# Altium footprint library SMT.PcbLib: 325 footprints (part 3 of 21)
Each footprint in its own frame and in the unit in brackets; x right, y up, seen from the top. Pads: shape width x height; smd on the part's side, far side on the other; paste and mask are expansions set on the pad; w line width, h text height; cw(c..) or ccw(c..) is an arc to the next point about the centre after c.
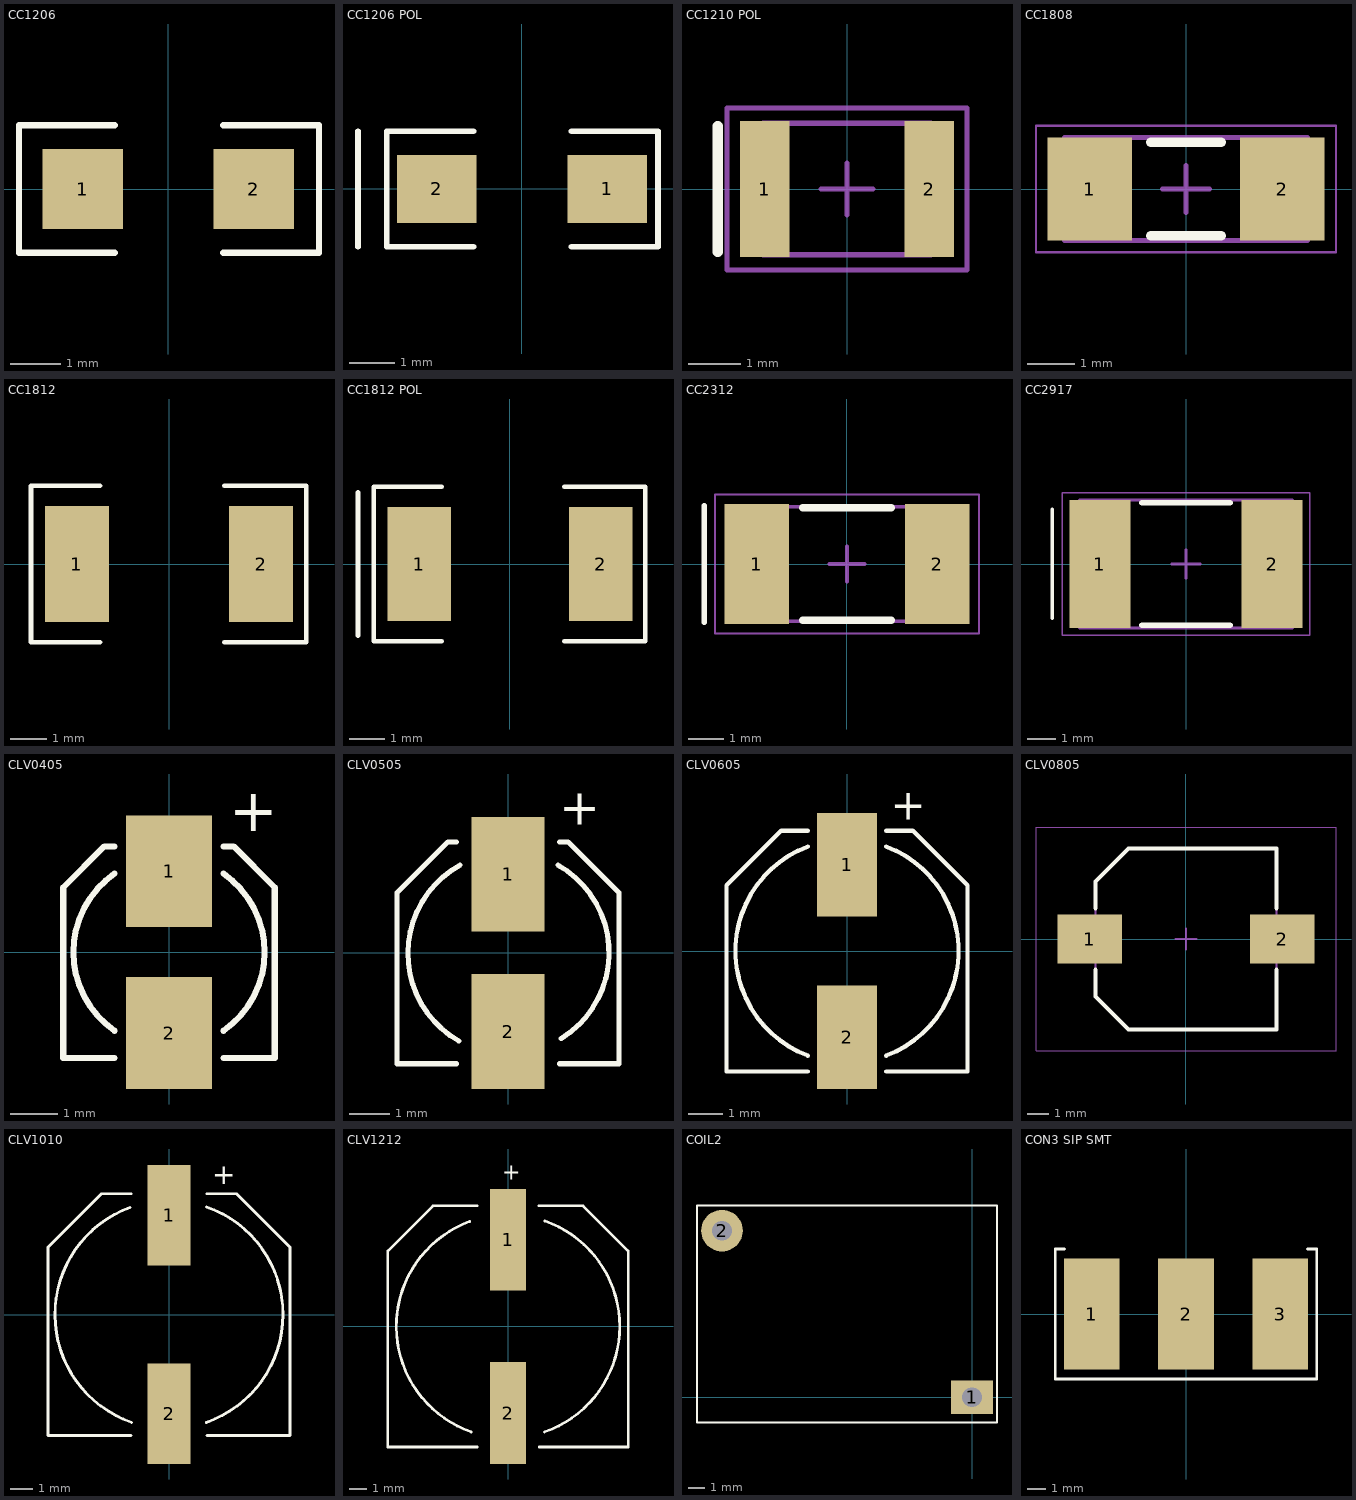
[diagram p2: the footprints below, top view; thin cyan lines are the x and y axes]

## CC1206 [mil]
pads (2):
  rect 63x63 smd: 1(-67,0) 2(67,0)
TopOverlay:
  lines w5: -42,-50 -117,-50 -117,50 -42,50 ; 43,-50 118,-50 118,50 43,50

## CC1206 POL [mm]
pads (2):
  rect 1.75x1.5 smd: 1(1.875,0) 2(-1.875,0)
TopOverlay:
  lines w0.127: -3.607,-1.27 -3.607,1.27 ; -1.067,-1.27 -2.972,-1.27 -2.972,1.27 -1.067,1.27 ; 1.092,-1.27 2.997,-1.27 2.997,1.27 1.092,1.27
3D body: height 0.75, standoff 0, extent -1.75,-0.75 1.75,0.75

## CC1210 POL [mm]
height 2.79
pads (2):
  rect 0.95x2.6 smd: 1(-1.575,0) 2(1.575,0)
TopOverlay:
  lines w0.2: -2.478,-1.2 -2.478,1.2
Mechanical13:
  lines w0.1: -1.61,-1.26 1.61,-1.26 1.61,1.26 -1.61,1.26 -1.61,-1.26
Mechanical15:
  lines w0.1: -0.5,0 0.5,0 ; 0,-0.5 0,0.5 ; -2.3,-1.55 2.3,-1.55 2.3,1.55 -2.3,1.55 -2.3,-1.55
3D body: height 2.79, standoff 0, extent -1.61,-1.26 1.61,1.26

## CC1808 [mm]
height 1.6
pads (2):
  rect 1.8x2.2 smd: 1(-2.05,0) 2(2.05,0)
TopOverlay:
  lines w0.2: -0.75,-1 0.75,-1 ; -0.75,1 0.75,1
Mechanical13:
  lines w0.1: -2.6,-1.1 2.6,-1.1 2.6,1.1 -2.6,1.1 -2.6,-1.1
Mechanical15:
  lines w0.05: -3.2,-1.35 3.2,-1.35 3.2,1.35 -3.2,1.35 -3.2,-1.35
  lines w0.1: -0.5,0 0.5,0 ; 0,-0.5 0,0.5
3D body: height 1.6, standoff 0, extent 2,-1.1 2.6,1.1
3D body: height 1.6, standoff 0, extent -2.6,-1.1 -2,1.1
3D body: height 1.6, standoff 0, extent -2,-1.1 2,1.1

## CC1812 [mil]
pads (2):
  rect 70x126 smd: 1(-100,0) 2(100,0)
TopOverlay:
  lines w5: -75,-85 -150,-85 -150,85 -75,85 ; 60,-85 149,-85 149,85 60,85
3D body: height 66.93, standoff 0, extent 64.96,-62.99 88.58,62.99
3D body: height 66.93, standoff 0, extent -88.59,-62.99 -64.97,62.99
3D body: height 66.93, standoff 0, extent -64.96,-62.99 64.96,62.99

## CC1812 POL [mil]
pads (2):
  rect 70x126 smd: 1(-100,0) 2(100,0)
TopOverlay:
  lines w5: -167.32,-78.74 -167.32,78.74 ; -75,-85 -150,-85 -150,85 -75,85 ; 60,-85 149,-85 149,85 60,85
3D body: height 66.93, standoff 0, extent -64.96,-62.99 64.96,63
3D body: height 66.93, standoff 0, extent -88.59,-62.99 -64.96,63
3D body: height 66.93, standoff 0, extent 64.96,-62.99 88.59,63

## CC2312 [mm] "CASE C"
height 0.066
pads (2):
  rect 1.8x3.35 smd: 1(-2.525,0) 2(2.525,0)
TopOverlay:
  lines w0.152: -4,-1.625 -4,1.625
  lines w0.2: -1.25,-1.575 1.25,-1.575 ; -1.25,1.575 1.25,1.575
Mechanical13:
  lines w0.1: -3,-1.6 -3,1.6 3,1.6 3,-1.6 -3,-1.6
Mechanical15:
  lines w0.05: -3.7,-1.95 -3.7,1.95 3.7,1.95 3.7,-1.95 -3.7,-1.95
  lines w0.1: -0.5,0 0.5,0 ; 0,-0.5 0,0.5
3D body: height 2.6, standoff 0, extent -1.7,-1.6 1.7,1.6
3D body: height 2.6, standoff 0, extent -3,-1.6 -1.7,1.6
3D body: height 2.6, standoff 0, extent 1.7,-1.6 3,1.6

## CC2917 [mm] "Chip Capacitor, 2-Leads, Body 7.30x4.30mm, IPC Medium Density"
height 3.1
pads (2):
  rect 2.15x4.5 smd: 1(-3.025,0) 2(3.025,0)
TopOverlay:
  lines w0.127: -4.699,-1.905 -4.699,1.93
  lines w0.2: -1.55,-2.15 1.55,-2.15 ; -1.55,2.15 1.55,2.15
Mechanical13:
  lines w0.1: -3.75,-2.25 3.75,-2.25 3.75,2.25 -3.75,2.25 -3.75,-2.25
Mechanical15:
  lines w0.05: -4.35,-2.5 4.35,-2.5 4.35,2.5 -4.35,2.5 -4.35,-2.5
  lines w0.1: -0.5,0 0.5,0 ; 0,-0.5 0,0.5
3D body: height 3.1, standoff 0, extent 2.45,-2.25 3.75,2.25
3D body: height 3.1, standoff 0, extent -3.75,-2.25 -2.45,2.25
3D body: height 3.1, standoff 0, extent -2.45,-2.25 2.45,2.25

## CLV0405 [mm] "Aluminum Electrolytic Capacitor SMD Chip"
height 0.14
pads (2):
  rect 1.8x2.35 smd: 1(0,1.7) 2(0,-1.7)
TopOverlay:
  lines w0.127: -1.143,-2.222 -2.222,-2.222 -2.222,1.359 -1.359,2.222 -1.143,2.222 ; -1.143,-1.651 cw(c0,0) -1.143,1.651 ; 1.143,-2.222 2.222,-2.222 2.222,1.359 1.359,2.222 1.143,2.222 ; 1.143,-1.651 ccw(c0,0) 1.143,1.651
  text "+" at 1.27,2.54 h0.89

## CLV0505 [mm] "Aluminum Electrolytic Capacitor SMD Chip"
height 0.14
pads (2):
  rect 1.8x2.85 smd: 1(0,1.95) 2(0,-1.95)
TopOverlay:
  lines w0.127: -2.75,0 -2.75,-2.75 -1.277,-2.75 ; -2.75,0.019 -2.75,1.492 -1.492,2.75 -1.277,2.75 ; -1.22,-2.186 cw(c0.017,-0.013) -1.188,2.178 ; 1.24,2.177 cw(c0.006,0.003) 1.316,-2.126 ; 1.277,-2.75 2.75,-2.75 2.75,0 2.75,1.492 1.492,2.75 1.277,2.75
  text "+" at 1.27,3.175 h0.89

## CLV0605 [mm] "Aluminum Electrolytic Capacitor SMD Chip"
pads (2):
  rect 1.75x3 smd: 1(0,2.5) 2(0,-2.5)
TopOverlay:
  lines w0.127: -1.143,-3.492 -3.492,-3.492 -3.492,1.905 -1.905,3.492 -1.143,3.492 ; -1.137,-3.032 cw(c0,0) -1.137,3.032 ; 1.137,-3.032 ccw(c0,0) 1.137,3.032 ; 1.143,-3.492 3.492,-3.492 3.492,1.905 1.905,3.492 1.143,3.492
  text "+" at 1.27,3.81 h0.89
3D body: height 1, standoff 0, extent -3.492,-3.492 3.492,3.492
3D body: height 7.7, standoff 0, extent -3.15,-3.147 3.15,3.147

## CLV0805 [mm]
pads (2):
  rect 3.05x2.3 smd: 1(-4.525,0) 2(4.525,0)
TopOverlay:
  lines w0.2: -4.25,-1.45 -4.25,-2.7 -2.7,-4.25 4.25,-4.25 4.25,-1.45 ; -4.25,1.45 -4.25,2.7 -2.7,4.25 4.25,4.25 4.25,1.45
Mechanical13:
  lines w0.1: -4.25,-2.7 -4.25,2.7 -2.7,4.25 4.25,4.25 4.25,-4.25 -2.7,-4.25 -4.25,-2.7
Mechanical15:
  lines w0.05: -7.05,-5.25 7.05,-5.25 7.05,5.25 -7.05,5.25 -7.05,-5.25
  lines w0.1: -0.5,0 0.5,0 ; 0,-0.5 0,0.5
3D body: height 10.2, standoff 0, extent -4.25,-4.25 4.25,4.25
3D body: height 3.4, standoff 0, extent -4.25,-4.25 4.25,4.25

## CLV1010 [mm] "Aluminum Electrolytic Capacitor SMD Chip"
height 0.269
pads (2):
  rect 1.9x4.4 smd: 1(0,4.35) 2(0,-4.35)
TopOverlay:
  lines w0.127: -1.71,4.698 ccw(c0,0) -1.642,-4.723 ; -1.668,-5.3 -5.3,-5.3 -5.3,0 -5.3,2.955 -2.955,5.3 -1.668,5.3 ; 1.634,-4.726 ccw(c0,0) 1.642,4.723 ; 1.668,-5.3 5.3,-5.3 5.3,0 5.3,2.955 2.955,5.3 1.668,5.3
  text "+" at 1.905,5.715 h0.89

## CLV1212 [mm]
height 13.8
pads (2):
  rect 2x5.7 smd: 1(0,4.85) 2(0,-4.85)
TopOverlay:
  lines w0.152: -2.138,5.873 ccw(c0,0) -2.052,-5.904 ; -1.725,-6.75 -6.725,-6.75 -6.725,0 -6.725,4.225 -4.2,6.75 -1.725,6.75 ; 1.725,6.75 4.2,6.75 6.725,4.225 6.725,0 6.725,-6.75 1.75,-6.75 ; 2.042,-5.907 ccw(c0,0) 2.052,5.904
  text "+" at -0.325,8.2 h0.89

## COIL2 [mil]
pads (2):
  rect 100x80 hole 47: 1(0,0)
  round 100 hole 47: 2(-600,400)
TopOverlay:
  lines w5: -660,-60 -660,460 60,460 60,-60 -660,-60

## CON3 SIP SMT [mm] "PCB solder 3 con"
pads (3):
  rect 3x6 smd: 1(-5.08,0) 2(0,0) 3(5.08,0)
TopOverlay:
  lines w0.152: -6.54,3.5 -7.04,3.5 -7.04,-3.5 7.04,-3.5 7.04,3.5 6.54,3.5